# Altium footprint library FPC_FFC_Connectors.PcbLib: 27 footprints (part 1 of 2)
Each footprint in its own frame and in the unit in brackets; x right, y up, seen from the top. Pads: shape width x height; smd on the part's side, far side on the other; paste and mask are expansions set on the pad; w line width, h text height; cw(c..) or ccw(c..) is an arc to the next point about the centre after c.
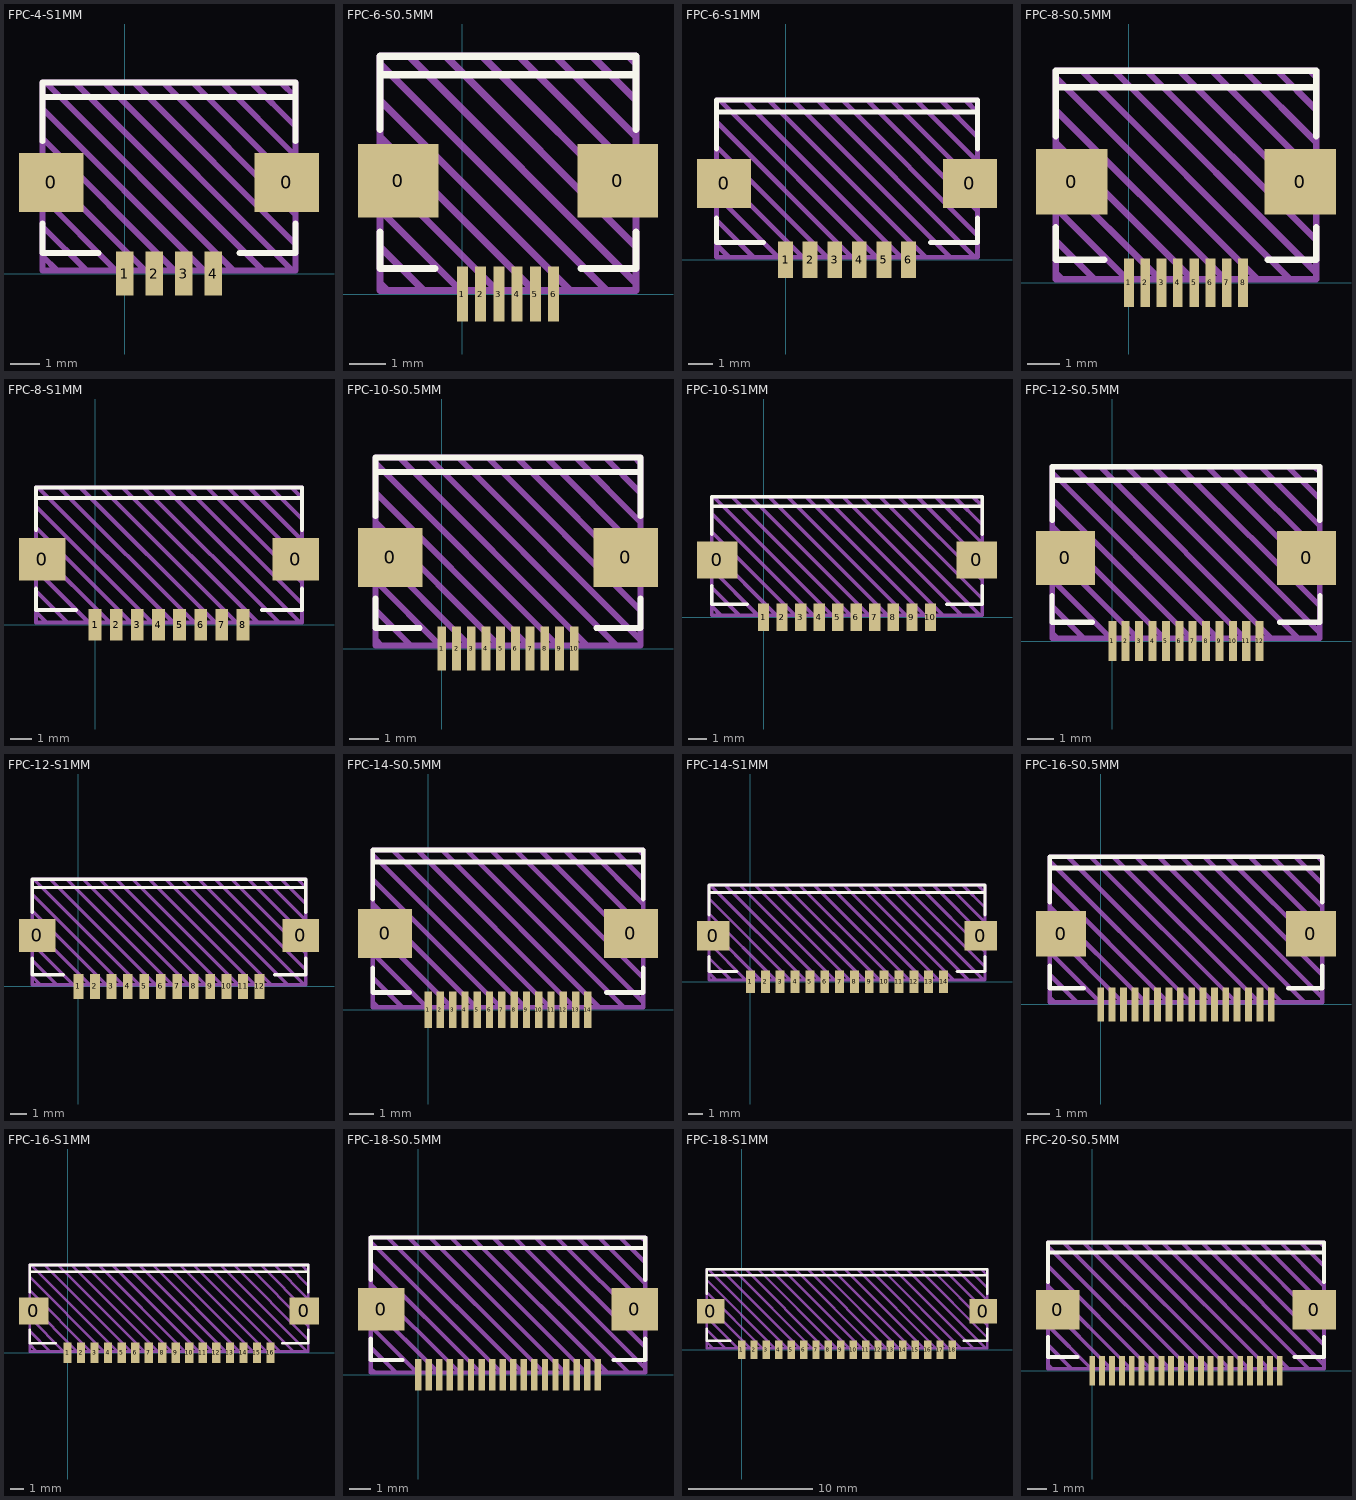
[diagram p0: the footprints below, top view; thin cyan lines are the x and y axes]

## FPC-4-S1MM [mm]
pads (6):
  rect 2.2x2 smd: 0(-2.5,3.1) 0(5.5,3.1)
  rect 0.6x1.5 smd: 1(0,0) 2(1,0) 3(2,0) 4(3,0)
Top Overlay:
  lines w0.2: -2.8,1.7 -2.8,0.7 -0.9,0.7 ; -2.8,4.5 -2.8,6.5 5.8,6.5 5.8,4.5 ; -2.8,6 5.8,6 ; 3.9,0.7 5.8,0.7 5.8,1.7
Top Draw:
  lines w0.2: -2.8,0.6 -2.3,0.1 ; -2.8,1.6 -1.3,0.1 ; -2.8,2.6 -0.3,0.1 ; -2.8,3.6 0.7,0.1 ; -2.8,4.6 1.7,0.1 ; -2.8,5.6 2.7,0.1 ; -2.7,6.5 3.7,0.1 ; -1.7,6.5 4.7,0.1 ; -0.7,6.5 5.7,0.1 ; 0.3,6.5 5.8,1 ; 1.3,6.5 5.8,2 ; 2.3,6.5 5.8,3 ; 3.3,6.5 5.8,4 ; 4.3,6.5 5.8,5 ; 5.3,6.5 5.8,6 ; -2.8,0.1 -2.8,6.5 5.8,6.5 5.8,0.1 -2.8,0.1
Top Info:
  text "'.Comment'" at -2.749,-2.283 h1
3D body "686104148922 (rev1).stp": height 2.25, standoff 0, extent -2.8,0.05 5.8,6.55

## FPC-6-S0.5MM [mm]
pads (8):
  rect 2.2x2 smd: 0(-1.75,3.1) 0(4.25,3.1)
  rect 0.3x1.5 smd: 1(0,0) 2(0.5,0) 3(1,0) 4(1.5,0) 5(2,0) 6(2.5,0)
Top Overlay:
  lines w0.2: -2.25,1.7 -2.25,0.7 -0.75,0.7 ; -2.25,4.5 -2.25,6.5 4.75,6.5 4.75,4.5 ; -2.25,6 4.75,6 ; 3.25,0.7 4.75,0.7 4.75,1.7
Top Draw:
  lines w0.2: -2.25,0.3 -2.05,0.1 ; -2.25,1.3 -1.05,0.1 ; -2.25,2.3 -0.05,0.1 ; -2.25,3.3 0.95,0.1 ; -2.25,4.3 1.95,0.1 ; -2.25,5.3 2.95,0.1 ; -2.25,6.3 3.95,0.1 ; -1.45,6.5 4.75,0.3 ; -0.45,6.5 4.75,1.3 ; 0.55,6.5 4.75,2.3 ; 1.55,6.5 4.75,3.3 ; 2.55,6.5 4.75,4.3 ; 3.55,6.5 4.75,5.3 ; 4.55,6.5 4.75,6.3 ; -2.25,0.1 4.75,0.1 4.75,6.5 -2.25,6.5 -2.25,0.1
Top Info:
  text "'.Comment'" at -2.999,-2.283 h1
3D body "687106149022 (rev1).stp": height 2.25, standoff 0, extent -2.3,0.05 4.8,6.55

## FPC-6-S1MM [mm]
pads (8):
  rect 2.2x2 smd: 0(-2.5,3.1) 0(7.5,3.1)
  rect 0.6x1.5 smd: 1(0,0) 2(1,0) 3(2,0) 4(3,0) 5(4,0) 6(5,0)
Top Overlay:
  lines w0.2: -2.8,1.7 -2.8,0.7 -0.9,0.7 ; -2.8,4.5 -2.8,6.5 7.8,6.5 7.8,4.5 ; -2.8,6 7.8,6 ; 5.9,0.7 7.8,0.7 7.8,1.7
Top Draw:
  lines w0.2: -2.8,0.6 -2.3,0.1 ; -2.8,1.6 -1.3,0.1 ; -2.8,2.6 -0.3,0.1 ; -2.8,3.6 0.7,0.1 ; -2.8,4.6 1.7,0.1 ; -2.8,5.6 2.7,0.1 ; -2.7,6.5 3.7,0.1 ; -1.7,6.5 4.7,0.1 ; -0.7,6.5 5.7,0.1 ; 0.3,6.5 6.7,0.1 ; 1.3,6.5 7.7,0.1 ; 2.3,6.5 7.8,1 ; 3.3,6.5 7.8,2 ; 4.3,6.5 7.8,3 ; 5.3,6.5 7.8,4 ; 6.3,6.5 7.8,5 ; 7.3,6.5 7.8,6 ; -2.8,0.1 -2.8,6.5 7.8,6.5 7.8,0.1 -2.8,0.1
Top Info:
  text "'.Comment'" at -1.749,-2.283 h1
3D body "686106148922 (rev1).stp": height 2.25, standoff 0, extent -2.8,0.05 7.8,6.55

## FPC-8-S0.5MM [mm]
pads (10):
  rect 2.2x2 smd: 0(-1.75,3.1) 0(5.25,3.1)
  rect 0.3x1.5 smd: 1(0,0) 2(0.5,0) 3(1,0) 4(1.5,0) 5(2,0) 6(2.5,0) 7(3,0) 8(3.5,0)
Top Overlay:
  lines w0.2: -2.25,1.7 -2.25,0.7 -0.75,0.7 ; -2.25,4.5 -2.25,6.5 5.75,6.5 5.75,4.5 ; -2.25,6 5.75,6 ; 4.25,0.7 5.75,0.7 5.75,1.7
Top Draw:
  lines w0.2: -2.25,0.3 -2.05,0.1 ; -2.25,1.3 -1.05,0.1 ; -2.25,2.3 -0.05,0.1 ; -2.25,3.3 0.95,0.1 ; -2.25,4.3 1.95,0.1 ; -2.25,5.3 2.95,0.1 ; -2.25,6.3 3.95,0.1 ; -1.45,6.5 4.95,0.1 ; -0.45,6.5 5.75,0.3 ; 0.55,6.5 5.75,1.3 ; 1.55,6.5 5.75,2.3 ; 2.55,6.5 5.75,3.3 ; 3.55,6.5 5.75,4.3 ; 4.55,6.5 5.75,5.3 ; 5.55,6.5 5.75,6.3 ; -2.25,0.1 5.75,0.1 5.75,6.5 -2.25,6.5 -2.25,0.1
Top Info:
  text "'.Comment'" at -2.499,-2.283 h1
3D body "687108149022 (rev1).stp": height 2.25, standoff 0, extent -2.3,0.05 5.8,6.55

## FPC-8-S1MM [mm]
pads (10):
  rect 2.2x2 smd: 0(-2.5,3.1) 0(9.5,3.1)
  rect 0.6x1.5 smd: 1(0,0) 2(1,0) 3(2,0) 4(3,0) 5(4,0) 6(5,0) 7(6,0) 8(7,0)
Top Overlay:
  lines w0.2: -2.8,1.7 -2.8,0.7 -0.9,0.7 ; -2.8,4.5 -2.8,6.5 9.8,6.5 9.8,4.5 ; -2.8,6 9.8,6 ; 7.9,0.7 9.8,0.7 9.8,1.7
Top Draw:
  lines w0.2: -2.8,0.6 -2.3,0.1 ; -2.8,1.6 -1.3,0.1 ; -2.8,2.6 -0.3,0.1 ; -2.8,3.6 0.7,0.1 ; -2.8,4.6 1.7,0.1 ; -2.8,5.6 2.7,0.1 ; -2.7,6.5 3.7,0.1 ; -1.7,6.5 4.7,0.1 ; -0.7,6.5 5.7,0.1 ; 0.3,6.5 6.7,0.1 ; 1.3,6.5 7.7,0.1 ; 2.3,6.5 8.7,0.1 ; 3.3,6.5 9.7,0.1 ; 4.3,6.5 9.8,1 ; 5.3,6.5 9.8,2 ; 6.3,6.5 9.8,3 ; 7.3,6.5 9.8,4 ; 8.3,6.5 9.8,5 ; 9.3,6.5 9.8,6 ; -2.8,0.1 -2.8,6.5 9.8,6.5 9.8,0.1 -2.8,0.1
Top Info:
  text "'.Comment'" at -0.749,-2.283 h1
3D body "686108148922 (rev1).stp": height 2.25, standoff 0, extent -2.8,0.05 9.8,6.55

## FPC-10-S0.5MM [mm]
pads (12):
  rect 2.2x2 smd: 0(-1.75,3.1) 0(6.25,3.1)
  rect 0.3x1.5 smd: 1(0,0) 2(0.5,0) 3(1,0) 4(1.5,0) 5(2,0) 6(2.5,0) 7(3,0) 8(3.5,0) 9(4,0) 10(4.5,0)
Top Overlay:
  lines w0.2: -2.25,1.7 -2.25,0.7 -0.75,0.7 ; -2.25,4.5 -2.25,6.5 6.75,6.5 6.75,4.5 ; -2.25,6 6.75,6 ; 5.25,0.7 6.75,0.7 6.75,1.7
Top Draw:
  lines w0.2: -2.25,0.3 -2.05,0.1 ; -2.25,1.3 -1.05,0.1 ; -2.25,2.3 -0.05,0.1 ; -2.25,3.3 0.95,0.1 ; -2.25,4.3 1.95,0.1 ; -2.25,5.3 2.95,0.1 ; -2.25,6.3 3.95,0.1 ; -1.45,6.5 4.95,0.1 ; -0.45,6.5 5.95,0.1 ; 0.55,6.5 6.75,0.3 ; 1.55,6.5 6.75,1.3 ; 2.55,6.5 6.75,2.3 ; 3.55,6.5 6.75,3.3 ; 4.55,6.5 6.75,4.3 ; 5.55,6.5 6.75,5.3 ; 6.55,6.5 6.75,6.3 ; -2.25,0.1 6.75,0.1 6.75,6.5 -2.25,6.5 -2.25,0.1
Top Info:
  text "'.Comment'" at -1.999,-2.283 h1
3D body "687110149022 (rev1).stp": height 2.25, standoff 0, extent -2.3,0.05 6.8,6.55

## FPC-10-S1MM [mm]
pads (12):
  rect 2.2x2 smd: 0(-2.5,3.1) 0(11.5,3.1)
  rect 0.6x1.5 smd: 1(0,0) 2(1,0) 3(2,0) 4(3,0) 5(4,0) 6(5,0) 7(6,0) 8(7,0) 9(8,0) 10(9,0)
Top Overlay:
  lines w0.2: -2.8,1.7 -2.8,0.7 -0.9,0.7 ; -2.8,4.5 -2.8,6.5 11.8,6.5 11.8,4.5 ; -2.8,6 11.8,6 ; 9.9,0.7 11.8,0.7 11.8,1.7
Top Draw:
  lines w0.2: -2.8,0.6 -2.3,0.1 ; -2.8,1.6 -1.3,0.1 ; -2.8,2.6 -0.3,0.1 ; -2.8,3.6 0.7,0.1 ; -2.8,4.6 1.7,0.1 ; -2.8,5.6 2.7,0.1 ; -2.7,6.5 3.7,0.1 ; -1.7,6.5 4.7,0.1 ; -0.7,6.5 5.7,0.1 ; 0.3,6.5 6.7,0.1 ; 1.3,6.5 7.7,0.1 ; 2.3,6.5 8.7,0.1 ; 3.3,6.5 9.7,0.1 ; 4.3,6.5 10.7,0.1 ; 5.3,6.5 11.7,0.1 ; 6.3,6.5 11.8,1 ; 7.3,6.5 11.8,2 ; 8.3,6.5 11.8,3 ; 9.3,6.5 11.8,4 ; 10.3,6.5 11.8,5 ; 11.3,6.5 11.8,6 ; -2.8,0.1 11.8,0.1 11.8,6.5 -2.8,6.5 -2.8,0.1
Top Info:
  text "'.Comment'" at 0.251,-2.283 h1
3D body "686110148922 (rev1).stp": height 2.25, standoff 0, extent -2.8,0.05 11.8,6.55

## FPC-12-S0.5MM [mm]
pads (14):
  rect 2.2x2 smd: 0(-1.75,3.1) 0(7.25,3.1)
  rect 0.3x1.5 smd: 1(0,0) 2(0.5,0) 3(1,0) 4(1.5,0) 5(2,0) 6(2.5,0) 7(3,0) 8(3.5,0) 9(4,0) 10(4.5,0) 11(5,0) 12(5.5,0)
Top Overlay:
  lines w0.2: -2.25,1.7 -2.25,0.7 -0.75,0.7 ; -2.25,4.5 -2.25,6.5 7.75,6.5 7.75,4.5 ; -2.25,6 7.75,6 ; 6.25,0.7 7.75,0.7 7.75,1.7
Top Draw:
  lines w0.2: -2.25,0.3 -2.05,0.1 ; -2.25,1.3 -1.05,0.1 ; -2.25,2.3 -0.05,0.1 ; -2.25,3.3 0.95,0.1 ; -2.25,4.3 1.95,0.1 ; -2.25,5.3 2.95,0.1 ; -2.25,6.3 3.95,0.1 ; -1.45,6.5 4.95,0.1 ; -0.45,6.5 5.95,0.1 ; 0.55,6.5 6.95,0.1 ; 1.55,6.5 7.75,0.3 ; 2.55,6.5 7.75,1.3 ; 3.55,6.5 7.75,2.3 ; 4.55,6.5 7.75,3.3 ; 5.55,6.5 7.75,4.3 ; 6.55,6.5 7.75,5.3 ; 7.55,6.5 7.75,6.3 ; -2.25,0.1 -2.25,6.5 7.75,6.5 7.75,0.1 -2.25,0.1
Top Info:
  text "'.Comment'" at -1.499,-2.283 h1
3D body "687112149022 (rev1).stp": height 2.25, standoff 0, extent -2.3,0.05 7.8,6.55

## FPC-12-S1MM [mm]
pads (14):
  rect 2.2x2 smd: 0(-2.5,3.1) 0(13.5,3.1)
  rect 0.6x1.5 smd: 1(0,0) 2(1,0) 3(2,0) 4(3,0) 5(4,0) 6(5,0) 7(6,0) 8(7,0) 9(8,0) 10(9,0) 11(10,0) 12(11,0)
Top Overlay:
  lines w0.2: -2.8,1.7 -2.8,0.7 -0.9,0.7 ; -2.8,4.5 -2.8,6.5 13.8,6.5 13.8,4.5 ; -2.8,6 13.8,6 ; 11.9,0.7 13.8,0.7 13.8,1.7
Top Draw:
  lines w0.2: -2.8,0.6 -2.3,0.1 ; -2.8,1.6 -1.3,0.1 ; -2.8,2.6 -0.3,0.1 ; -2.8,3.6 0.7,0.1 ; -2.8,4.6 1.7,0.1 ; -2.8,5.6 2.7,0.1 ; -2.7,6.5 3.7,0.1 ; -1.7,6.5 4.7,0.1 ; -0.7,6.5 5.7,0.1 ; 0.3,6.5 6.7,0.1 ; 1.3,6.5 7.7,0.1 ; 2.3,6.5 8.7,0.1 ; 3.3,6.5 9.7,0.1 ; 4.3,6.5 10.7,0.1 ; 5.3,6.5 11.7,0.1 ; 6.3,6.5 12.7,0.1 ; 7.3,6.5 13.7,0.1 ; 8.3,6.5 13.8,1 ; 9.3,6.5 13.8,2 ; 10.3,6.5 13.8,3 ; 11.3,6.5 13.8,4 ; 12.3,6.5 13.8,5 ; 13.3,6.5 13.8,6 ; -2.8,0.1 13.8,0.1 13.8,6.5 -2.8,6.5 -2.8,0.1
Top Info:
  text "'.Comment'" at 1.251,-2.283 h1
3D body "686112148922 (rev1).stp": height 2.25, standoff 0, extent -2.8,0.05 13.8,6.55

## FPC-14-S0.5MM [mm]
pads (16):
  rect 2.2x2 smd: 0(-1.75,3.1) 0(8.25,3.1)
  rect 0.3x1.5 smd: 1(0,0) 2(0.5,0) 3(1,0) 4(1.5,0) 5(2,0) 6(2.5,0) 7(3,0) 8(3.5,0) 9(4,0) 10(4.5,0) 11(5,0) 12(5.5,0) 13(6,0) 14(6.5,0)
Top Overlay:
  lines w0.2: -2.25,1.7 -2.25,0.7 -0.75,0.7 ; -2.25,4.5 -2.25,6.5 8.75,6.5 8.75,4.5 ; -2.25,6 8.75,6 ; 7.25,0.7 8.75,0.7 8.75,1.7
Top Draw:
  lines w0.2: -2.25,0.3 -2.05,0.1 ; -2.25,1.3 -1.05,0.1 ; -2.25,2.3 -0.05,0.1 ; -2.25,3.3 0.95,0.1 ; -2.25,4.3 1.95,0.1 ; -2.25,5.3 2.95,0.1 ; -2.25,6.3 3.95,0.1 ; -1.45,6.5 4.95,0.1 ; -0.45,6.5 5.95,0.1 ; 0.55,6.5 6.95,0.1 ; 1.55,6.5 7.95,0.1 ; 2.55,6.5 8.75,0.3 ; 3.55,6.5 8.75,1.3 ; 4.55,6.5 8.75,2.3 ; 5.55,6.5 8.75,3.3 ; 6.55,6.5 8.75,4.3 ; 7.55,6.5 8.75,5.3 ; 8.55,6.5 8.75,6.3 ; -2.25,0.1 8.75,0.1 8.75,6.5 -2.25,6.5 -2.25,0.1
Top Info:
  text "'.Comment'" at -0.999,-2.283 h1
3D body "687114149022 (rev1).stp": height 2.25, standoff 0, extent -2.3,0.05 8.8,6.55

## FPC-14-S1MM [mm]
pads (16):
  rect 2.2x2 smd: 0(-2.5,3.1) 0(15.5,3.1)
  rect 0.6x1.5 smd: 1(0,0) 2(1,0) 3(2,0) 4(3,0) 5(4,0) 6(5,0) 7(6,0) 8(7,0) 9(8,0) 10(9,0) 11(10,0) 12(11,0) 13(12,0) 14(13,0)
Top Overlay:
  lines w0.2: -2.8,1.7 -2.8,0.7 -0.9,0.7 ; -2.8,4.5 -2.8,6.5 15.8,6.5 15.8,4.5 ; -2.8,6 15.8,6 ; 13.9,0.7 15.8,0.7 15.8,1.7
Top Draw:
  lines w0.2: -2.8,0.6 -2.3,0.1 ; -2.8,1.6 -1.3,0.1 ; -2.8,2.6 -0.3,0.1 ; -2.8,3.6 0.7,0.1 ; -2.8,4.6 1.7,0.1 ; -2.8,5.6 2.7,0.1 ; -2.7,6.5 3.7,0.1 ; -1.7,6.5 4.7,0.1 ; -0.7,6.5 5.7,0.1 ; 0.3,6.5 6.7,0.1 ; 1.3,6.5 7.7,0.1 ; 2.3,6.5 8.7,0.1 ; 3.3,6.5 9.7,0.1 ; 4.3,6.5 10.7,0.1 ; 5.3,6.5 11.7,0.1 ; 6.3,6.5 12.7,0.1 ; 7.3,6.5 13.7,0.1 ; 8.3,6.5 14.7,0.1 ; 9.3,6.5 15.7,0.1 ; 10.3,6.5 15.8,1 ; 11.3,6.5 15.8,2 ; 12.3,6.5 15.8,3 ; 13.3,6.5 15.8,4 ; 14.3,6.5 15.8,5 ; 15.3,6.5 15.8,6 ; -2.8,0.1 -2.8,6.5 15.8,6.5 15.8,0.1 -2.8,0.1
Top Info:
  text "'.Comment'" at 2.251,-2.283 h1
3D body "686114148922 (rev1).stp": height 1.1, standoff -1.15, extent -2.8,0.05 15.8,6.55

## FPC-16-S0.5MM [mm]
pads (18):
  rect 2.2x2 smd: 0(-1.75,3.1) 0(9.25,3.1)
  rect 0.3x1.5 smd: 1(0,0) 2(0.5,0) 3(1,0) 4(1.5,0) 5(2,0) 6(2.5,0) 7(3,0) 8(3.5,0) 9(4,0) 10(4.5,0) 11(5,0) 12(5.5,0) 13(6,0) 14(6.5,0) 15(7,0) 16(7.5,0)
Top Overlay:
  lines w0.2: -2.25,1.7 -2.25,0.7 -0.75,0.7 ; -2.25,4.5 -2.25,6.5 9.75,6.5 9.75,4.5 ; -2.25,6 9.75,6 ; 8.25,0.7 9.75,0.7 9.75,1.7
Top Draw:
  lines w0.2: -2.25,0.3 -2.05,0.1 ; -2.25,1.3 -1.05,0.1 ; -2.25,2.3 -0.05,0.1 ; -2.25,3.3 0.95,0.1 ; -2.25,4.3 1.95,0.1 ; -2.25,5.3 2.95,0.1 ; -2.25,6.3 3.95,0.1 ; -1.45,6.5 4.95,0.1 ; -0.45,6.5 5.95,0.1 ; 0.55,6.5 6.95,0.1 ; 1.55,6.5 7.95,0.1 ; 2.55,6.5 8.95,0.1 ; 3.55,6.5 9.75,0.3 ; 4.55,6.5 9.75,1.3 ; 5.55,6.5 9.75,2.3 ; 6.55,6.5 9.75,3.3 ; 7.55,6.5 9.75,4.3 ; 8.55,6.5 9.75,5.3 ; 9.55,6.5 9.75,6.3 ; -2.25,0.1 9.75,0.1 9.75,6.5 -2.25,6.5 -2.25,0.1
Top Info:
  text "'.Comment'" at -0.499,-2.283 h1
3D body "687116149022 (rev1).stp": height 2.25, standoff 0, extent -2.3,0.05 9.8,6.55

## FPC-16-S1MM [mm]
pads (18):
  rect 2.2x2 smd: 0(-2.5,3.1) 0(17.5,3.1)
  rect 0.6x1.5 smd: 1(0,0) 2(1,0) 3(2,0) 4(3,0) 5(4,0) 6(5,0) 7(6,0) 8(7,0) 9(8,0) 10(9,0) 11(10,0) 12(11,0) 13(12,0) 14(13,0) 15(14,0) 16(15,0)
Top Overlay:
  lines w0.2: -2.8,1.7 -2.8,0.7 -0.9,0.7 ; -2.8,4.5 -2.8,6.5 17.8,6.5 17.8,4.5 ; -2.8,6 17.8,6 ; 15.9,0.7 17.8,0.7 17.8,1.7
Top Draw:
  lines w0.2: -2.8,0.6 -2.3,0.1 ; -2.8,1.6 -1.3,0.1 ; -2.8,2.6 -0.3,0.1 ; -2.8,3.6 0.7,0.1 ; -2.8,4.6 1.7,0.1 ; -2.8,5.6 2.7,0.1 ; -2.7,6.5 3.7,0.1 ; -1.7,6.5 4.7,0.1 ; -0.7,6.5 5.7,0.1 ; 0.3,6.5 6.7,0.1 ; 1.3,6.5 7.7,0.1 ; 2.3,6.5 8.7,0.1 ; 3.3,6.5 9.7,0.1 ; 4.3,6.5 10.7,0.1 ; 5.3,6.5 11.7,0.1 ; 6.3,6.5 12.7,0.1 ; 7.3,6.5 13.7,0.1 ; 8.3,6.5 14.7,0.1 ; 9.3,6.5 15.7,0.1 ; 10.3,6.5 16.7,0.1 ; 11.3,6.5 17.7,0.1 ; 12.3,6.5 17.8,1 ; 13.3,6.5 17.8,2 ; 14.3,6.5 17.8,3 ; 15.3,6.5 17.8,4 ; 16.3,6.5 17.8,5 ; 17.3,6.5 17.8,6 ; -2.8,0.1 -2.8,6.5 17.8,6.5 17.8,0.1 -2.8,0.1
Top Info:
  text "'.Comment'" at 3.251,-2.283 h1
3D body "686116148922 (rev1).stp": height 2.25, standoff 0, extent -2.8,0.05 17.8,6.55

## FPC-18-S0.5MM [mm]
pads (20):
  rect 2.2x2 smd: 0(-1.75,3.1) 0(10.25,3.1)
  rect 0.3x1.5 smd: 1(0,0) 2(0.5,0) 3(1,0) 4(1.5,0) 5(2,0) 6(2.5,0) 7(3,0) 8(3.5,0) 9(4,0) 10(4.5,0) 11(5,0) 12(5.5,0) 13(6,0) 14(6.5,0) 15(7,0) 16(7.5,0) 17(8,0) 18(8.5,0)
Top Overlay:
  lines w0.2: -2.25,1.7 -2.25,0.7 -0.75,0.7 ; -2.25,4.5 -2.25,6.5 10.75,6.5 10.75,4.5 ; -2.25,6 10.75,6 ; 9.25,0.7 10.75,0.7 10.75,1.7
Top Draw:
  lines w0.2: -2.25,0.3 -2.05,0.1 ; -2.25,1.3 -1.05,0.1 ; -2.25,2.3 -0.05,0.1 ; -2.25,3.3 0.95,0.1 ; -2.25,4.3 1.95,0.1 ; -2.25,5.3 2.95,0.1 ; -2.25,6.3 3.95,0.1 ; -1.45,6.5 4.95,0.1 ; -0.45,6.5 5.95,0.1 ; 0.55,6.5 6.95,0.1 ; 1.55,6.5 7.95,0.1 ; 2.55,6.5 8.95,0.1 ; 3.55,6.5 9.95,0.1 ; 4.55,6.5 10.75,0.3 ; 5.55,6.5 10.75,1.3 ; 6.55,6.5 10.75,2.3 ; 7.55,6.5 10.75,3.3 ; 8.55,6.5 10.75,4.3 ; 9.55,6.5 10.75,5.3 ; 10.55,6.5 10.75,6.3 ; -2.25,0.1 -2.25,6.5 10.75,6.5 10.75,0.1 -2.25,0.1
Top Info:
  text "'.Comment'" at 0.001,-2.283 h1
3D body "687118149022 (rev1).stp": height 2.25, standoff 0, extent -2.3,0.05 10.8,6.55

## FPC-18-S1MM [mm]
pads (20):
  rect 2.2x2 smd: 0(-2.5,3.1) 0(19.5,3.1)
  rect 0.6x1.5 smd: 1(0,0) 2(1,0) 3(2,0) 4(3,0) 5(4,0) 6(5,0) 7(6,0) 8(7,0) 9(8,0) 10(9,0) 11(10,0) 12(11,0) 13(12,0) 14(13,0) 15(14,0) 16(15,0) 17(16,0) 18(17,0)
Top Overlay:
  lines w0.2: -2.8,1.7 -2.8,0.7 -0.9,0.7 ; -2.8,4.5 -2.8,6.5 19.8,6.5 19.8,4.5 ; -2.8,6 19.8,6 ; 17.9,0.7 19.8,0.7 19.8,1.7
Top Draw:
  lines w0.2: -2.8,0.6 -2.3,0.1 ; -2.8,1.6 -1.3,0.1 ; -2.8,2.6 -0.3,0.1 ; -2.8,3.6 0.7,0.1 ; -2.8,4.6 1.7,0.1 ; -2.8,5.6 2.7,0.1 ; -2.7,6.5 3.7,0.1 ; -1.7,6.5 4.7,0.1 ; -0.7,6.5 5.7,0.1 ; 0.3,6.5 6.7,0.1 ; 1.3,6.5 7.7,0.1 ; 2.3,6.5 8.7,0.1 ; 3.3,6.5 9.7,0.1 ; 4.3,6.5 10.7,0.1 ; 5.3,6.5 11.7,0.1 ; 6.3,6.5 12.7,0.1 ; 7.3,6.5 13.7,0.1 ; 8.3,6.5 14.7,0.1 ; 9.3,6.5 15.7,0.1 ; 10.3,6.5 16.7,0.1 ; 11.3,6.5 17.7,0.1 ; 12.3,6.5 18.7,0.1 ; 13.3,6.5 19.7,0.1 ; 14.3,6.5 19.8,1 ; 15.3,6.5 19.8,2 ; 16.3,6.5 19.8,3 ; 17.3,6.5 19.8,4 ; 18.3,6.5 19.8,5 ; 19.3,6.5 19.8,6 ; -2.8,0.1 -2.8,6.5 19.8,6.5 19.8,0.1 -2.8,0.1
Top Info:
  text "'.Comment'" at 4.251,-2.283 h1
3D body "686118148922 (rev1).stp": height 2.25, standoff 0, extent -2.8,0.05 19.8,6.55

## FPC-20-S0.5MM [mm]
pads (22):
  rect 2.2x2 smd: 0(-1.75,3.1) 0(11.25,3.1)
  rect 0.3x1.5 smd: 1(0,0) 2(0.5,0) 3(1,0) 4(1.5,0) 5(2,0) 6(2.5,0) 7(3,0) 8(3.5,0) 9(4,0) 10(4.5,0) 11(5,0) 12(5.5,0) 13(6,0) 14(6.5,0) 15(7,0) 16(7.5,0) 17(8,0) 18(8.5,0) 19(9,0) 20(9.5,0)
Top Overlay:
  lines w0.2: -2.25,1.7 -2.25,0.7 -0.75,0.7 ; -2.25,4.5 -2.25,6.5 11.75,6.5 11.75,4.5 ; -2.25,6 11.75,6 ; 10.25,0.7 11.75,0.7 11.75,1.7
Top Draw:
  lines w0.2: -2.25,0.3 -2.05,0.1 ; -2.25,1.3 -1.05,0.1 ; -2.25,2.3 -0.05,0.1 ; -2.25,3.3 0.95,0.1 ; -2.25,4.3 1.95,0.1 ; -2.25,5.3 2.95,0.1 ; -2.25,6.3 3.95,0.1 ; -1.45,6.5 4.95,0.1 ; -0.45,6.5 5.95,0.1 ; 0.55,6.5 6.95,0.1 ; 1.55,6.5 7.95,0.1 ; 2.55,6.5 8.95,0.1 ; 3.55,6.5 9.95,0.1 ; 4.55,6.5 10.95,0.1 ; 5.55,6.5 11.75,0.3 ; 6.55,6.5 11.75,1.3 ; 7.55,6.5 11.75,2.3 ; 8.55,6.5 11.75,3.3 ; 9.55,6.5 11.75,4.3 ; 10.55,6.5 11.75,5.3 ; 11.55,6.5 11.75,6.3 ; -2.25,0.1 -2.25,6.5 11.75,6.5 11.75,0.1 -2.25,0.1
Top Info:
  text "'.Comment'" at 0.501,-2.283 h1
3D body "687120149022 (rev1).stp": height 2.25, standoff 0, extent -2.3,0.05 11.8,6.55